# Altium footprint library LHAC-4XDSP2XV7-VP5_0226_3.PcbLib: 96 footprints (part 8 of 12) (continued)
## FFG1158 [mil] "FFG1158" (continued)
  text "AB6" at -452.8,-165.2 h10
  text "AM20" at 98.4,-554.9 h10
  text "V6" at -452.8,-11.7 h10
  text "AJ21" at 137.8,-436.8 h10
  text "W7" at -413.4,-51.1 h10
  text "AM5" at -492.1,-558.9 h10
  text "Y6" at -452.8,-90.4 h10
  text "AC3" at -570.9,-204.5 h10
  text "AM18" at 19.7,-554.9 h10
  text "AM10" at -295.3,-554.9 h10
  text "AD6" at -452.8,-243.9 h10
  text "AE3" at -570.9,-283.3 h10
  text "AM21" at 137.8,-554.9 h10
  text "AP5" at -492.1,-637.6 h10
  text "Y5" at -492.1,-90.4 h10
  text "AL8" at -374,-519.5 h10
  text "J8" at -374,342.6 h10
  text "AP16" at -59.1,-633.6 h10
  text "AG3" at -570.9,-362 h10
  text "AH17" at -19.7,-397.4 h10
  text "AC4" at -531.5,-204.5 h10
  text "AK5" at -492.1,-480.1 h10
  text "AL9" at -334.6,-519.5 h10
  text "AK6" at -452.8,-480.1 h10
  text "AF13" at -177.2,-318.6 h10
  text "AP9" at -334.6,-637.6 h10
  text "AP12" at -216.5,-633.6 h10
  text "AL3" at -570.9,-519.5 h10
  text "AH13" at -177.2,-397.4 h10
  text "AE4" at -531.5,-283.3 h10
  text "AA3" at -570.9,-125.8 h10
  text "G7" at -413.4,421.4 h10
  text "AH5" at -492.1,-401.4 h10
  text "AJ17" at -19.7,-436.8 h10
  text "AH6" at -452.8,-401.4 h10
  text "AE14" at -137.8,-279.3 h10
  text "AF5" at -492.1,-322.6 h10
  text "AF6" at -452.8,-322.6 h10
  text "AK17" at -19.7,-476.1 h10
  text "AP6" at -452.8,-637.6 h10
  text "AJ10" at -295.3,-436.8 h10
  text "AL24" at 255.9,-515.5 h10
  text "AK21" at 137.8,-476.1 h10
  text "AM17" at -19.7,-554.9 h10
  text "AN18" at 19.7,-594.2 h10
  text "AE12" at -216.5,-279.3 h10
  text "AL10" at -295.3,-515.5 h10
  text "AH20" at 98.4,-397.4 h10
  text "AF24" at 255.9,-318.6 h10
  text "AL15" at -98.4,-515.5 h10
  text "AP19" at 59.1,-633.6 h10
  text "AK18" at 19.7,-476.1 h10
  text "AP15" at -98.4,-633.6 h10
  text "AG31" at 531.5,-358 h10
  text "AL32" at 570.9,-515.5 h10
  text "AK16" at -59.1,-476.1 h10
  text "V29" at 452.8,-7.7 h10
  text "AE32" at 570.9,-279.3 h10
  text "Y30" at 492.1,-86.4 h10
  text "AA31" at 531.5,-121.8 h10
  text "AM30" at 492.1,-554.9 h10
  text "AG32" at 570.9,-358 h10
  text "AE31" at 531.5,-279.3 h10
  text "AA32" at 570.9,-121.8 h10
  text "AG18" at 19.7,-358 h10
  text "W28" at 413.4,-47.1 h10
  text "AP25" at 295.3,-633.6 h10
  text "AN23" at 216.5,-594.2 h10
  text "AH29" at 452.8,-397.4 h10
  text "AK13" at -177.2,-476.1 h10
  text "AH15" at -98.4,-397.4 h10
  text "AF30" at 492.1,-318.6 h10
  text "AM22" at 177.2,-554.9 h10
  text "AP20" at 98.4,-633.6 h10
  text "AH30" at 492.1,-397.4 h10
  text "AE16" at -59.1,-279.3 h10
  text "AP29" at 452.8,-633.6 h10
  text "AK30" at 492.1,-476.1 h10
  text "AD16" at -59.1,-239.9 h10
  text "AM8" at -374,-558.9 h10
  text "AF16" at -59.1,-318.6 h10
  text "AM29" at 452.8,-554.9 h10
  text "AN24" at 255.9,-594.2 h10
  text "AK11" at -255.9,-476.1 h10
  text "Y29" at 452.8,-86.4 h10
  text "AM16" at -59.1,-554.9 h10
  text "AP14" at -137.8,-633.6 h10
  text "AB30" at 492.1,-161.2 h10
  text "AK29" at 452.8,-476.1 h10
  text "AE24" at 255.9,-279.3 h10
  text "AF15" at -98.4,-318.6 h10
  text "AN22" at 177.2,-594.2 h10
  text "AP30" at 492.1,-633.6 h10
  text "AL21" at 137.8,-515.5 h10
  text "AL14" at -137.8,-515.5 h10
  text "AL31" at 531.5,-515.5 h10
  text "AE23" at 216.5,-279.3 h10
  text "AF29" at 452.8,-318.6 h10
  text "AE11" at -255.9,-279.3 h10
  text "AG10" at -295.3,-358 h10
  text "AN17" at -19.7,-594.2 h10
  text "G28" at 413.4,425.4 h10
  text "AD30" at 492.1,-239.9 h10
  text "AF18" at 19.7,-318.6 h10
  text "AM27" at 374,-554.9 h10
  text "AJ11" at -255.9,-436.8 h10
  text "AG12" at -216.5,-358 h10
  text "AK24" at 255.9,-476.1 h10
  text "AL16" at -59.1,-515.5 h10
  text "AH12" at -216.5,-397.4 h10
  text "AJ9" at -334.6,-440.8 h10
  text "AH14" at -137.8,-397.4 h10
  text "AN27" at 374,-594.2 h10
  text "AH24" at 255.9,-397.4 h10
  text "AL19" at 59.1,-515.5 h10
  text "AE13" at -177.2,-279.3 h10
  text "AC31" at 531.5,-200.5 h10
  text "AE22" at 177.2,-279.3 h10
  text "AG17" at -19.7,-358 h10
  text "AF20" at 98.4,-318.6 h10
  text "K21" at 137.8,307.3 h10
  text "AP24" at 255.9,-633.6 h10
  text "AN14" at -137.8,-594.2 h10
  text "AL23" at 216.5,-515.5 h10
  text "AF23" at 216.5,-318.6 h10
  text "W27" at 374,-47.1 h10
  text "AH18" at 19.7,-397.4 h10
  text "AP17" at -19.7,-633.6 h10
  text "AD29" at 452.8,-239.9 h10
  text "AK9" at -334.6,-480.1 h10
  text "AC32" at 570.9,-200.5 h10
  text "AK14" at -137.8,-476.1 h10
  text "J17" at -19.7,346.6 h10
  text "V30" at 492.1,-7.7 h10
  text "AF14" at -137.8,-318.6 h10
  text "AD14" at -137.8,-239.9 h10
  text "AN15" at -98.4,-594.2 h10
  text "AE18" at 19.7,-279.3 h10
  text "AB29" at 452.8,-161.2 h10
  text "AK19" at 59.1,-476.1 h10
  text "AJ16" at -59.1,-436.8 h10
  text "AP21" at 137.8,-633.6 h10
  text "AN9" at -334.6,-598.2 h10
  text "AG13" at -177.2,-358 h10
  text "AM13" at -177.2,-554.9 h10
  text "G22" at 177.2,425.4 h10
  text "AH19" at 59.1,-397.4 h10
  text "AJ20" at 98.4,-436.8 h10
  text "AF11" at -255.9,-318.6 h10
  text "AL25" at 295.3,-515.5 h10
  text "AJ15" at -98.4,-436.8 h10
  text "AL18" at 19.7,-515.5 h10
  text "AK23" at 216.5,-476.1 h10
  text "AE19" at 59.1,-279.3 h10
  text "AK8" at -374,-480.1 h10
  text "AP22" at 177.2,-633.6 h10
  text "AP26" at 334.6,-633.6 h10
  text "R11" at -255.9,110.4 h10
  text "AL20" at 98.4,-515.5 h10
  text "V25" at 295.3,-7.7 h10
  text "P21" at 137.8,149.8 h10
  text "AM15" at -98.4,-554.9 h10
  text "Y18" at 19.7,-86.4 h10
  text "AL11" at -255.9,-515.5 h10
  text "AN20" at 98.4,-594.2 h10
  text "V17" at -19.7,-7.7 h10
  text "AM25" at 295.3,-554.9 h10
  text "E21" at 137.8,504.1 h10
  text "AP11" at -255.9,-633.6 h10
  text "Y10" at -295.3,-86.4 h10
  text "V18" at 19.7,-7.7 h10
  text "AN10" at -295.3,-594.2 h10
  text "W10" at -295.3,-47.1 h10
  text "AE7" at -413.4,-283.3 h10
  text "AE8" at -374,-283.3 h10
  text "AP1" at -649.6,-637.6 h10
  text "AN3" at -570.9,-598.2 h10
  text "AM1" at -649.6,-558.9 h10
  text "AK1" at -649.6,-480.1 h10
  text "AP2" at -610.2,-637.6 h10
  text "AN4" at -531.5,-598.2 h10
  text "AM2" at -610.2,-558.9 h10
  text "AK2" at -610.2,-480.1 h10
  text "AC7" at -413.4,-204.5 h10
  text "AC8" at -374,-204.5 h10
  text "AJ3" at -570.9,-440.8 h10
  text "AH1" at -649.6,-401.4 h10
  text "AF1" at -649.6,-322.6 h10
  text "AD1" at -649.6,-243.9 h10
  text "AJ4" at -531.5,-440.8 h10
  text "AH2" at -610.2,-401.4 h10
  text "AF2" at -610.2,-322.6 h10
  text "AD2" at -610.2,-243.9 h10
  text "AA7" at -413.4,-125.8 h10
  text "AA8" at -374,-125.8 h10
  text "AB1" at -649.6,-165.2 h10
  text "Y1" at -649.6,-90.4 h10
  text "W3" at -570.9,-51.1 h10
  text "V1" at -649.6,-11.7 h10
  text "AB2" at -610.2,-165.2 h10
  text "Y2" at -610.2,-90.4 h10
  text "W4" at -531.5,-51.1 h10
  text "V2" at -610.2,-11.7 h10
  text "U7" at -413.4,27.7 h10
  text "U8" at -374,27.7 h10
  text "N7" at -413.4,185.2 h10
  text "N8" at -374,185.2 h10
  text "L7" at -413.4,263.9 h10
  text "L8" at -374,263.9 h10
  text "E3" at -570.9,500.1 h10
  text "D5" at -492.1,539.5 h10
  text "C3" at -570.9,578.9 h10
  text "B5" at -492.1,618.2 h10
  text "E4" at -531.5,500.1 h10
  text "D6" at -452.8,539.5 h10
  text "C4" at -531.5,578.9 h10
  text "B6" at -452.8,618.2 h10
  text "AE28" at 413.4,-279.3 h10
  text "AE27" at 374,-279.3 h10
  text "AC28" at 413.4,-200.5 h10
  text "AC27" at 374,-200.5 h10
  text "AA28" at 413.4,-121.8 h10
  text "AA27" at 374,-121.8 h10
  text "U28" at 413.4,31.7 h10
  text "U27" at 374,31.7 h10
  text "N28" at 413.4,189.2 h10
  text "N27" at 374,189.2 h10
  text "J28" at 413.4,346.6 h10
  text "J27" at 374,346.6 h10
  text "L28" at 413.4,267.9 h10
  text "L27" at 374,267.9 h10
  text "E32" at 570.9,504.1 h10
  text "D30" at 492.1,543.5 h10
  text "C32" at 570.9,582.9 h10
  text "B30" at 492.1,622.2 h10
  text "E31" at 531.5,504.1 h10
  text "D29" at 452.8,543.5 h10
  text "C31" at 531.5,582.9 h10
  text "B29" at 452.8,622.2 h10
  text "F34" at 649.6,464.8 h10
  text "D34" at 649.6,543.5 h10
  text "B34" at 649.6,622.2 h10
  text "A32" at 570.9,661.6 h10
  text "F33" at 610.2,464.8 h10
  text "D33" at 610.2,543.5 h10
  text "B33" at 610.2,622.2 h10
  text "A31" at 531.5,661.6 h10
  text "AM11" at -255.9,-554.9 h10
  text "B17" at -19.7,622.2 h10
  text "N12" at -216.5,189.2 h10
  text "J12" at -216.5,346.6 h10
  text "M12" at -216.5,228.5 h10
  text "H10" at -295.3,386 h10
  text "M10" at -295.3,228.5 h10
  text "J11" at -255.9,346.6 h10
  text "K12" at -216.5,307.3 h10
  text "G13" at -177.2,425.4 h10
  text "M11" at -255.9,228.5 h10
  text "G12" at -216.5,425.4 h10
  text "J10" at -295.3,346.6 h10
  text "K11" at -255.9,307.3 h10
  text "E24" at 255.9,504.1 h10
  text "F24" at 255.9,464.8 h10
  text "G25" at 295.3,425.4 h10
  text "N10" at -295.3,189.2 h10
  text "F25" at 295.3,464.8 h10
  text "A4" at -531.5,657.6 h10
  text "A3" at -570.9,657.6 h10
  text "B1" at -649.6,618.2 h10
  text "K18" at 19.7,307.3 h10
  text "L19" at 59.1,267.9 h10
  text "K19" at 59.1,307.3 h10
  text "G18" at 19.7,425.4 h10
  text "D22" at 177.2,543.5 h10
  text "G20" at 98.4,425.4 h10
  text "AG22" at 177.2,-358 h10
  text "AH22" at 177.2,-397.4 h10
  text "AH23" at 216.5,-397.4 h10
  text "AG23" at 216.5,-358 h10
  text "AJ22" at 177.2,-436.8 h10
  text "A16" at -59.1,661.6 h10
  text "M20" at 98.4,228.5 h10
  text "AJ25" at 295.3,-436.8 h10
  text "AH25" at 295.3,-397.4 h10
  text "AK22" at 177.2,-476.1 h10
  text "E12" at -216.5,504.1 h10
  text "AH11" at -255.9,-397.4 h10
  text "AJ8" at -374,-440.8 h10
  text "AM9" at -334.6,-558.9 h10
  text "AG14" at -137.8,-358 h10
  text "AG24" at 255.9,-358 h10
  text "AF17" at -19.7,-318.6 h10
  text "AE20" at 98.4,-279.3 h10
  text "AL12" at -216.5,-515.5 h10
  text "AK15" at -98.4,-476.1 h10
  text "AJ18" at 19.7,-436.8 h10
  text "AP13" at -177.2,-633.6 h10
  text "AM19" at 59.1,-554.9 h10
  text "AN16" at -59.1,-594.2 h10
  text "AH21" at 137.8,-397.4 h10
  text "AK25" at 295.3,-476.1 h10
  text "AN26" at 334.6,-594.2 h10
  text "AP23" at 216.5,-633.6 h10
  text "AL22" at 177.2,-515.5 h10
  text "J16" at -59.1,346.6 h10
  text "H19" at 59.1,386 h10
  text "E22" at 177.2,504.1 h10
  text "P22" at 177.2,149.8 h10
  text "G23" at 216.5,425.4 h10
  text "D19" at 59.1,543.5 h10
  text "H18" at 19.7,386 h10
  text "J21" at 137.8,346.6 h10
  text "G15" at -98.4,425.4 h10
  text "E17" at -19.7,504.1 h10
  text "L18" at 19.7,267.9 h10
  text "L15" at -98.4,267.9 h10
  text "L14" at -137.8,267.9 h10
  text "D16" at -59.1,543.5 h10
  text "M21" at 137.8,228.5 h10
  text "F13" at -177.2,464.8 h10
  text "J14" at -137.8,346.6 h10
  text "K14" at -137.8,307.3 h10
  text "P24" at 255.9,149.8 h10
  text "H15" at -98.4,386 h10
  text "B25" at 295.3,622.2 h10
  text "D12" at -216.5,543.5 h10
  text "L13" at -177.2,267.9 h10
  text "N17" at -19.7,189.2 h10
  text "N14" at -137.8,189.2 h10
  text "AH10" at -295.3,-397.4 h10
  text "AJ14" at -137.8,-436.8 h10
  text "AG16" at -59.1,-358 h10
  text "AG21" at 137.8,-358 h10
  text "AK27" at 374,-476.1 h10
  text "M15" at -98.4,228.5 h10
  text "M13" at -177.2,228.5 h10
  text "K17" at -19.7,307.3 h10
  text "L16" at -59.1,267.9 h10
  text "E13" at -177.2,504.1 h10
  text "P15" at -98.4,149.8 h10
  text "P16" at -59.1,149.8 h10
  text "N15" at -98.4,189.2 h10
  text "K16" at -59.1,307.3 h10
  text "K13" at -177.2,307.3 h10
  text "P14" at -137.8,149.8 h10
  text "M16" at -59.1,228.5 h10
  text "N13" at -177.2,189.2 h10
  text "Y11" at -255.9,-86.4 h10
  text "V11" at -255.9,-7.7 h10
  text "AA12" at -216.5,-121.8 h10
  text "W12" at -216.5,-47.1 h10
  text "U12" at -216.5,31.7 h10
  text "T11" at -255.9,71.1 h10
  text "R12" at -216.5,110.4 h10
  text "R10" at -295.3,110.4 h10
  text "AC10" at -295.3,-200.5 h10
  text "AB11" at -255.9,-161.2 h10
  text "AD11" at -255.9,-239.9 h10
  text "AC12" at -216.5,-200.5 h10
  text "R20" at 98.4,110.4 h10
  text "Y19" at 59.1,-86.4 h10
  text "T19" at 59.1,71.1 h10
  text "U18" at 19.7,31.7 h10
  text "Y15" at -98.4,-86.4 h10
  text "V15" at -98.4,-7.7 h10
  text "W16" at -59.1,-47.1 h10
  text "R18" at 19.7,110.4 h10
  text "U16" at -59.1,31.7 h10
  text "AA16" at -59.1,-121.8 h10
  text "V19" at 59.1,-7.7 h10
  text "U14" at -137.8,31.7 h10
  text "T17" at -19.7,71.1 h10
  text "T15" at -98.4,71.1 h10
  text "T13" at -177.2,71.1 h10
  text "R16" at -59.1,110.4 h10
  text "R14" at -137.8,110.4 h10
  text "AD19" at 59.1,-239.9 h10
  text "AB19" at 59.1,-161.2 h10
  text "AC16" at -59.1,-200.5 h10
  text "AD17" at -19.7,-239.9 h10
  text "AC18" at 19.7,-200.5 h10
  text "AD15" at -98.4,-239.9 h10
  text "AB17" at -19.7,-161.2 h10
  text "AB15" at -98.4,-161.2 h10
  text "U22" at 177.2,31.7 h10
  text "U24" at 255.9,31.7 h10
  text "R22" at 177.2,110.4 h10
  text "T25" at 295.3,71.1 h10
  text "T23" at 216.5,71.1 h10
  text "W24" at 255.9,-47.1 h10
  text "AA24" at 255.9,-121.8 h10
  text "W22" at 177.2,-47.1 h10
  text "V23" at 216.5,-7.7 h10
  text "AA22" at 177.2,-121.8 h10
  text "Y23" at 216.5,-86.4 h10
  text "R24" at 255.9,110.4 h10
  text "T21" at 137.8,71.1 h10
  text "AD23" at 216.5,-239.9 h10
  text "AC24" at 255.9,-200.5 h10
  text "AC22" at 177.2,-200.5 h10
  text "AD25" at 295.3,-239.9 h10
  text "AB23" at 216.5,-161.2 h10
  text "D1" at -649.6,539.5 h10
  text "F2" at -610.2,460.8 h10
  text "W32" at 570.9,-47.1 h10
  text "W31" at 531.5,-47.1 h10
  text "F1" at -649.6,460.8 h10
  text "D2" at -610.2,539.5 h10
  text "AB33" at 610.2,-161.2 h10
  text "V34" at 649.6,-7.7 h10
  text "Y33" at 610.2,-86.4 h10
  text "V33" at 610.2,-7.7 h10
  text "AB34" at 649.6,-161.2 h10
  text "Y34" at 649.6,-86.4 h10
  text "M17" at -19.7,228.5 h10
  text "D15" at -98.4,543.5 h10
  text "L24" at 255.9,267.9 h10
  text "J19" at 59.1,346.6 h10
  text "B10" at -295.3,622.2 h10
  text "B11" at -255.9,622.2 h10
  text "A9" at -334.6,657.6 h10
  text "A19" at 59.1,661.6 h10
  text "H24" at 255.9,386 h10
  text "K24" at 255.9,307.3 h10
  text "A20" at 98.4,661.6 h10
  text "C20" at 98.4,582.9 h10
  text "F23" at 216.5,464.8 h10
  text "L20" at 98.4,267.9 h10
  text "P20" at 98.4,149.8 h10
  text "H25" at 295.3,386 h10
  text "J24" at 255.9,346.6 h10
  text "J22" at 177.2,346.6 h10
  text "C27" at 374,582.9 h10
  text "D27" at 374,543.5 h10
  text "K22" at 177.2,307.3 h10
  text "J20" at 98.4,346.6 h10
  text "L21" at 137.8,267.9 h10
  text "E27" at 374,504.1 h10
  text "H23" at 216.5,386 h10
  text "A18" at 19.7,661.6 h10
  text "J25" at 295.3,346.6 h10
  text "B13" at -177.2,622.2 h10
  text "H17" at -19.7,386 h10
  text "D20" at 98.4,543.5 h10
  text "E11" at -255.9,504.1 h10
  text "M23" at 216.5,228.5 h10
  text "L25" at 295.3,267.9 h10
  text "C10" at -295.3,582.9 h10
  text "P19" at 59.1,149.8 h10
  text "M25" at 295.3,228.5 h10
  text "M18" at 19.7,228.5 h10
  text "N20" at 98.4,189.2 h10
  text "E23" at 216.5,504.1 h10
  text "L23" at 216.5,267.9 h10
  text "N22" at 177.2,189.2 h10
  text "C17" at -19.7,582.9 h10
  text "B20" at 98.4,622.2 h10
  text "P25" at 295.3,149.8 h10
  text "M22" at 177.2,228.5 h10
  text "A25" at 295.3,661.6 h10
  text "B27" at 374,622.2 h10
  text "E26" at 334.6,504.1 h10
  text "B23" at 216.5,622.2 h10
  text "C25" at 295.3,582.9 h10
  text "D24" at 255.9,543.5 h10
  text "D26" at 334.6,543.5 h10
  text "D25" at 295.3,543.5 h10
  text "F10" at -295.3,464.8 h10
  text "B16" at -59.1,622.2 h10
  text "E14" at -137.8,504.1 h10
  text "G16" at -59.1,425.4 h10
  text "P11" at -255.9,149.8 h10
  text "F16" at -59.1,464.8 h10
  text "D17" at -19.7,543.5 h10
  text "C8" at -374,578.9 h10
  text "H13" at -177.2,386 h10
  text "G10" at -295.3,425.4 h10
  text "E16" at -59.1,504.1 h10
  text "H14" at -137.8,386 h10
  text "P12" at -216.5,149.8 h10
  text "C9" at -334.6,578.9 h10
  text "C15" at -98.4,582.9 h10
  text "A15" at -98.4,661.6 h10
  text "A13" at -177.2,661.6 h10
  text "D9" at -334.6,539.5 h10
  text "G17" at -19.7,425.4 h10
  text "A8" at -374,657.6 h10
  text "D14" at -137.8,543.5 h10
  text "B8" at -374,618.2 h10
  text "B12" at -216.5,622.2 h10
  text "A11" at -255.9,661.6 h10
  text "C14" at -137.8,582.9 h10
  text "A14" at -137.8,661.6 h10
  text "B15" at -98.4,622.2 h10
  text "E2" at -610.2,500.1 h10
  text "B3" at -570.9,618.2 h10
  text "A2" at -610.2,657.6 h10
  text "C1" at -649.6,578.9 h10
  text "E1" at -649.6,500.1 h10
  text "A1" at -649.6,657.6 h10
  text "N1" at -649.6,185.2 h10
  text "L1" at -649.6,263.9 h10
  text "G1" at -649.6,421.4 h10
  text "N2" at -610.2,185.2 h10
  text "F3" at -570.9,460.8 h10
  text "K3" at -570.9,303.3 h10
  text "J2" at -610.2,342.6 h10
  text "J1" at -649.6,342.6 h10
  text "V3" at -570.9,-11.7 h10
  text "R1" at -649.6,106.4 h10
  text "P3" at -570.9,145.8 h10
  text "U2" at -610.2,27.7 h10
  text "AA1" at -649.6,-125.8 h10
  text "AA2" at -610.2,-125.8 h10
  text "W1" at -649.6,-51.1 h10
  text "U1" at -649.6,27.7 h10
  text "AF3" at -570.9,-322.6 h10
  text "AE1" at -649.6,-283.3 h10
  text "AC1" at -649.6,-204.5 h10
  text "AB3" at -570.9,-165.2 h10
  text "AJ2" at -610.2,-440.8 h10
  text "AG1" at -649.6,-362 h10
  text "AJ1" at -649.6,-440.8 h10
  text "AK3" at -570.9,-480.1 h10
  text "AE2" at -610.2,-283.3 h10
  text "AN1" at -649.6,-598.2 h10
  text "AP3" at -570.9,-637.6 h10
  text "AN2" at -610.2,-598.2 h10
  text "AL1" at -649.6,-519.5 h10
  text "C7" at -413.4,578.9 h10
  text "A6" at -452.8,657.6 h10
  text "C5" at -492.1,578.9 h10
  text "D7" at -413.4,539.5 h10
  text "D4" at -531.5,539.5 h10
  text "C11" at -255.9,582.9 h10
  text "E7" at -413.4,500.1 h10
  text "A7" at -413.4,657.6 h10
  text "A5" at -492.1,657.6 h10
  text "B7" at -413.4,618.2 h10
  text "E5" at -492.1,500.1 h10
  text "D8" at -374,539.5 h10
  text "B4" at -531.5,618.2 h10
  text "F7" at -413.4,460.8 h10
  text "K7" at -413.4,303.3 h10
  text "K8" at -374,303.3 h10
  text "F4" at -531.5,460.8 h10
  text "F8" at -374,460.8 h10
  text "L5" at -492.1,263.9 h10
  text "M9" at -334.6,224.5 h10
  text "J9" at -334.6,342.6 h10
  text "K9" at -334.6,303.3 h10
  text "H8" at -374,382 h10
  text "N9" at -334.6,185.2 h10
  text "F9" at -334.6,460.8 h10
  text "K4" at -531.5,303.3 h10
  text "H7" at -413.4,382 h10
  text "M8" at -374,224.5 h10
  text "M7" at -413.4,224.5 h10
  text "K10" at -295.3,307.3 h10
  text "G5" at -492.1,421.4 h10
  text "H9" at -334.6,382 h10
  text "L9" at -334.6,263.9 h10
  text "G9" at -334.6,421.4 h10
  text "M4" at -531.5,224.5 h10
  text "F12" at -216.5,464.8 h10
  text "H4" at -531.5,382 h10
  text "N11" at -255.9,189.2 h10
  text "J5" at -492.1,342.6 h10
  text "N5" at -492.1,185.2 h10
  text "R5" at -492.1,106.4 h10
  text "R9" at -334.6,106.4 h10
  text "P8" at -374,145.8 h10
  text "W11" at -255.9,-47.1 h10
  text "Y8" at -374,-90.4 h10
  text "AA9" at -334.6,-125.8 h10
  text "AA11" at -255.9,-121.8 h10
  text "Y9" at -334.6,-90.4 h10
  text "V4" at -531.5,-11.7 h10
  text "T4" at -531.5,67.1 h10
  text "W5" at -492.1,-51.1 h10
  text "T7" at -413.4,67.1 h10
  text "V8" at -374,-11.7 h10
  text "V9" at -334.6,-11.7 h10
  text "Y4" at -531.5,-90.4 h10
  text "V7" at -413.4,-11.7 h10
  text "P7" at -413.4,145.8 h10
  text "P9" at -334.6,145.8 h10
  text "Y7" at -413.4,-90.4 h10
  text "P4" at -531.5,145.8 h10
  text "AA5" at -492.1,-125.8 h10
  text "U5" at -492.1,27.7 h10
  text "W9" at -334.6,-51.1 h10
  text "U9" at -334.6,27.7 h10
  text "T8" at -374,67.1 h10
  text "T9" at -334.6,67.1 h10
  text "Y12" at -216.5,-86.4 h10
  text "U11" at -255.9,31.7 h10
  text "V12" at -216.5,-7.7 h10
  text "T12" at -216.5,71.1 h10
  text "AD9" at -334.6,-243.9 h10
  text "AD12" at -216.5,-239.9 h10
  text "AB4" at -531.5,-165.2 h10
  text "AJ13" at -177.2,-436.8 h10
  text "AK10" at -295.3,-476.1 h10
  text "AD7" at -413.4,-243.9 h10
  text "AC9" at -334.6,-204.5 h10
  text "AD8" at -374,-243.9 h10
  text "AH4" at -531.5,-401.4 h10
  text "AF4" at -531.5,-322.6 h10
  text "AE5" at -492.1,-283.3 h10
  text "AC5" at -492.1,-204.5 h10
  text "AD4" at -531.5,-243.9 h10
  text "AD10" at -295.3,-239.9 h10
  text "AB8" at -374,-165.2 h10
  text "AF12" at -216.5,-318.6 h10
  text "AG5" at -492.1,-362 h10
  text "AB7" at -413.4,-165.2 h10
  text "AB12" at -216.5,-161.2 h10
  text "AB9" at -334.6,-165.2 h10
  text "AJ5" at -492.1,-440.8 h10
  text "AK4" at -531.5,-480.1 h10
  text "AF7" at -413.4,-322.6 h10
  text "AG7" at -413.4,-362 h10
  text "AF8" at -374,-322.6 h10
  text "AJ7" at -413.4,-440.8 h10
  text "AG8" at -374,-362 h10
  text "AF9" at -334.6,-322.6 h10
  text "AG9" at -334.6,-362 h10
  text "AH8" at -374,-401.4 h10
  text "AH9" at -334.6,-401.4 h10
  text "AH7" at -413.4,-401.4 h10
  text "AE9" at -334.6,-283.3 h10
  text "AK7" at -413.4,-480.1 h10
  text "AL7" at -413.4,-519.5 h10
  text "AP4" at -531.5,-637.6 h10
  text "AM4" at -531.5,-558.9 h10
  text "AN5" at -492.1,-598.2 h10
  text "AN7" at -413.4,-598.2 h10
  text "AL5" at -492.1,-519.5 h10
  text "AP8" at -374,-637.6 h10
  text "AP7" at -413.4,-637.6 h10
  text "AN11" at -255.9,-594.2 h10
  text "AM7" at -413.4,-558.9 h10
  text "A17" at -19.7,661.6 h10
  text "D18" at 19.7,543.5 h10
  text "E15" at -98.4,504.1 h10
  text "B14" at -137.8,622.2 h10
  text "K20" at 98.4,307.3 h10
  text "M14" at -137.8,228.5 h10
  text "L17" at -19.7,267.9 h10
  text "G19" at 59.1,425.4 h10
  text "J13" at -177.2,346.6 h10
  text "H16" at -59.1,386 h10
  text "R17" at -19.7,110.4 h10
  text "AA13" at -177.2,-121.8 h10
  text "U15" at -98.4,31.7 h10
  text "Y20" at 98.4,-86.4 h10
  text "Y16" at -59.1,-86.4 h10
  text "U17" at -19.7,31.7 h10
  text "V14" at -137.8,-7.7 h10
  text "W13" at -177.2,-47.1 h10
  text "W15" at -98.4,-47.1 h10
  text "U19" at 59.1,31.7 h10
  text "R19" at 59.1,110.4 h10
  text "R15" at -98.4,110.4 h10
  text "T18" at 19.7,71.1 h10
  text "T14" at -137.8,71.1 h10
  text "T16" at -59.1,71.1 h10
  text "Y14" at -137.8,-86.4 h10
  text "V16" at -59.1,-7.7 h10
  text "P18" at 19.7,149.8 h10
  text "AA19" at 59.1,-121.8 h10
  text "AA15" at -98.4,-121.8 h10
  text "W19" at 59.1,-47.1 h10
  text "U13" at -177.2,31.7 h10
  text "T20" at 98.4,71.1 h10
  text "V20" at 98.4,-7.7 h10
  text "AE15" at -98.4,-279.3 h10
  text "AC13" at -177.2,-200.5 h10
  text "AC17" at -19.7,-200.5 h10
  text "AB16" at -59.1,-161.2 h10
  text "AK20" at 98.4,-476.1 h10
  text "AC19" at 59.1,-200.5 h10
  text "AB18" at 19.7,-161.2 h10
  text "AG19" at 59.1,-358 h10
  text "AH16" at -59.1,-397.4 h10
  text "AB14" at -137.8,-161.2 h10
  text "AC15" at -98.4,-200.5 h10
  text "AD20" at 98.4,-239.9 h10
  text "AB20" at 98.4,-161.2 h10
  text "AM14" at -137.8,-554.9 h10
  text "AP18" at 19.7,-633.6 h10
  text "AL17" at -19.7,-515.5 h10
  text "B28" at 413.4,622.2 h10
  text "B24" at 255.9,622.2 h10
  text "C21" at 137.8,582.9 h10
  text "E25" at 295.3,504.1 h10
  text "C28" at 413.4,582.9 h10
  text "D28" at 413.4,543.5 h10
  text "E28" at 413.4,504.1 h10
  text "F27" at 374,464.8 h10
  text "A27" at 374,661.6 h10
  text "A28" at 413.4,661.6 h10
  text "M26" at 334.6,228.5 h10
  text "F22" at 177.2,464.8 h10
  text "J23" at 216.5,346.6 h10
  text "N26" at 334.6,189.2 h10
  text "J26" at 334.6,346.6 h10
  text "F26" at 334.6,464.8 h10
  text "K27" at 374,307.3 h10
  text "K28" at 413.4,307.3 h10
  text "H27" at 374,386 h10
  text "M27" at 374,228.5 h10
  text "M28" at 413.4,228.5 h10
  text "H28" at 413.4,386 h10
  text "G26" at 334.6,425.4 h10
  text "N21" at 137.8,189.2 h10
  text "F28" at 413.4,464.8 h10
  text "M24" at 255.9,228.5 h10
  text "L26" at 334.6,267.9 h10
  text "H26" at 334.6,386 h10
  text "K26" at 334.6,307.3 h10
  text "P27" at 374,149.8 h10
  text "P28" at 413.4,149.8 h10
  text "V28" at 413.4,-7.7 h10
  text "R26" at 334.6,110.4 h10
  text "V22" at 177.2,-7.7 h10
  text "U21" at 137.8,31.7 h10
  text "AA23" at 216.5,-121.8 h10
  text "U26" at 334.6,31.7 h10
  text "AA21" at 137.8,-121.8 h10
  text "AA26" at 334.6,-121.8 h10
  text "T24" at 255.9,71.1 h10
  text "W26" at 334.6,-47.1 h10
  text "Y26" at 334.6,-86.4 h10
  text "V27" at 374,-7.7 h10
  text "Y22" at 177.2,-86.4 h10
  text "P26" at 334.6,149.8 h10
  text "U23" at 216.5,31.7 h10
  text "Y24" at 255.9,-86.4 h10
  text "Y27" at 374,-86.4 h10
  text "R21" at 137.8,110.4 h10
  text "T27" at 374,71.1 h10
  text "V24" at 255.9,-7.7 h10
  text "T28" at 413.4,71.1 h10
  text "Y28" at 413.4,-86.4 h10
  text "T22" at 177.2,71.1 h10
  text "T26" at 334.6,71.1 h10
  text "V26" at 334.6,-7.7 h10
  text "W21" at 137.8,-47.1 h10
  text "W23" at 216.5,-47.1 h10
  text "AE25" at 295.3,-279.3 h10
  text "AD22" at 177.2,-239.9 h10
  text "AB28" at 413.4,-161.2 h10
  text "AG27" at 374,-358 h10
  text "AF26" at 334.6,-318.6 h10
  text "AB22" at 177.2,-161.2 h10
  text "AC23" at 216.5,-200.5 h10
  text "AG26" at 334.6,-358 h10
  text "AE26" at 334.6,-279.3 h10
  text "AD26" at 334.6,-239.9 h10
  text "AD24" at 255.9,-239.9 h10
  text "AF22" at 177.2,-318.6 h10
  text "AB26" at 334.6,-161.2 h10
  text "AB24" at 255.9,-161.2 h10
  text "AC25" at 295.3,-200.5 h10
  text "AD27" at 374,-239.9 h10
  text "AD28" at 413.4,-239.9 h10
  text "AC26" at 334.6,-200.5 h10
  text "AB27" at 374,-161.2 h10
  text "AC21" at 137.8,-200.5 h10
  text "AH26" at 334.6,-397.4 h10
  text "AJ23" at 216.5,-436.8 h10
  text "AF27" at 374,-318.6 h10
  text "AG28" at 413.4,-358 h10
  text "AH27" at 374,-397.4 h10
  text "AJ28" at 413.4,-436.8 h10
  text "AF28" at 413.4,-318.6 h10
  text "AK28" at 413.4,-476.1 h10
  text "AH28" at 413.4,-397.4 h10
  text "AN21" at 137.8,-594.2 h10
  text "AP28" at 413.4,-633.6 h10
  text "AN28" at 413.4,-594.2 h10
  text "AL27" at 374,-515.5 h10
  text "AM28" at 413.4,-554.9 h10
  text "AL28" at 413.4,-515.5 h10
  text "AM24" at 255.9,-554.9 h10
  text "D31" at 531.5,543.5 h10
  text "C34" at 649.6,582.9 h10
  text "A29" at 452.8,661.6 h10
  text "E34" at 649.6,504.1 h10
  text "A30" at 492.1,661.6 h10
  text "B32" at 570.9,622.2 h10
  text "E33" at 610.2,504.1 h10
  text "A34" at 649.6,661.6 h10
  text "C30" at 492.1,582.9 h10
  text "B31" at 531.5,622.2 h10
  text "E30" at 492.1,504.1 h10
  text "A33" at 610.2,661.6 h10
  text "J33" at 610.2,346.6 h10
  text "K32" at 570.9,307.3 h10
  text "K31" at 531.5,307.3 h10
  text "G34" at 649.6,425.4 h10
  text "J34" at 649.6,346.6 h10
  text "L34" at 649.6,267.9 h10
  text "L30" at 492.1,267.9 h10
  text "F31" at 531.5,464.8 h10
  text "N33" at 610.2,189.2 h10
  text "M31" at 531.5,228.5 h10
  text "N30" at 492.1,189.2 h10
  text "F32" at 570.9,464.8 h10
  text "G30" at 492.1,425.4 h10
  text "H31" at 531.5,386 h10
  text "J30" at 492.1,346.6 h10
  text "N34" at 649.6,189.2 h10
  text "U33" at 610.2,31.7 h10
  text "AA30" at 492.1,-121.8 h10
  text "T31" at 531.5,71.1 h10
  text "U34" at 649.6,31.7 h10
  text "W30" at 492.1,-47.1 h10
  text "W34" at 649.6,-47.1 h10
  text "V32" at 570.9,-7.7 h10
  text "U30" at 492.1,31.7 h10
  text "P31" at 531.5,149.8 h10
  text "P32" at 570.9,149.8 h10
  text "R30" at 492.1,110.4 h10
  text "V31" at 531.5,-7.7 h10
  text "Y31" at 531.5,-86.4 h10
  text "AA34" at 649.6,-121.8 h10
  text "AA33" at 610.2,-121.8 h10
  text "R34" at 649.6,110.4 h10
  text "AK31" at 531.5,-476.1 h10
  text "AB31" at 531.5,-161.2 h10
  text "AB32" at 570.9,-161.2 h10
  text "AC30" at 492.1,-200.5 h10
  text "AD31" at 531.5,-239.9 h10
  text "AK32" at 570.9,-476.1 h10
  text "AJ34" at 649.6,-436.8 h10
  text "AF32" at 570.9,-318.6 h10
  text "AE30" at 492.1,-279.3 h10
  text "AH31" at 531.5,-397.4 h10
  text "AG34" at 649.6,-358 h10
  text "AG30" at 492.1,-358 h10
  text "AF31" at 531.5,-318.6 h10
  text "AE34" at 649.6,-279.3 h10
  text "AC34" at 649.6,-200.5 h10
  text "AE33" at 610.2,-279.3 h10
  text "AJ33" at 610.2,-436.8 h10
  text "AJ30" at 492.1,-436.8 h10
  text "AP32" at 570.9,-633.6 h10
  text "AL34" at 649.6,-515.5 h10
  text "AM31" at 531.5,-554.9 h10
  text "AN30" at 492.1,-594.2 h10
  text "AL30" at 492.1,-515.5 h10
  text "AN34" at 649.6,-594.2 h10
  text "AP31" at 531.5,-633.6 h10
  text "AN33" at 610.2,-594.2 h10
Mechanical 16:
  pour cut-out: -689,-689 689,-689 689,689 -689,689
  region: -689,-689 689,-689 689,689 -689,689
  lines w1: -689,-689 689,-689 689,689 -689,689 -689,-689
Mechanical 17:
  text ".Designator" at 0,13.33 h25
3D body: height 150, standoff 0, extent -689,-689 689,689